# Altium footprint library WE-RJ45 LAN.PcbLib: 107 footprints (part 1 of 7)
Each footprint in its own frame and in the unit in brackets; x right, y up, seen from the top. Pads: shape width x height; smd on the part's side, far side on the other; paste and mask are expansions set on the pad; w line width, h text height; cw(c..) or ccw(c..) is an arc to the next point about the centre after c.
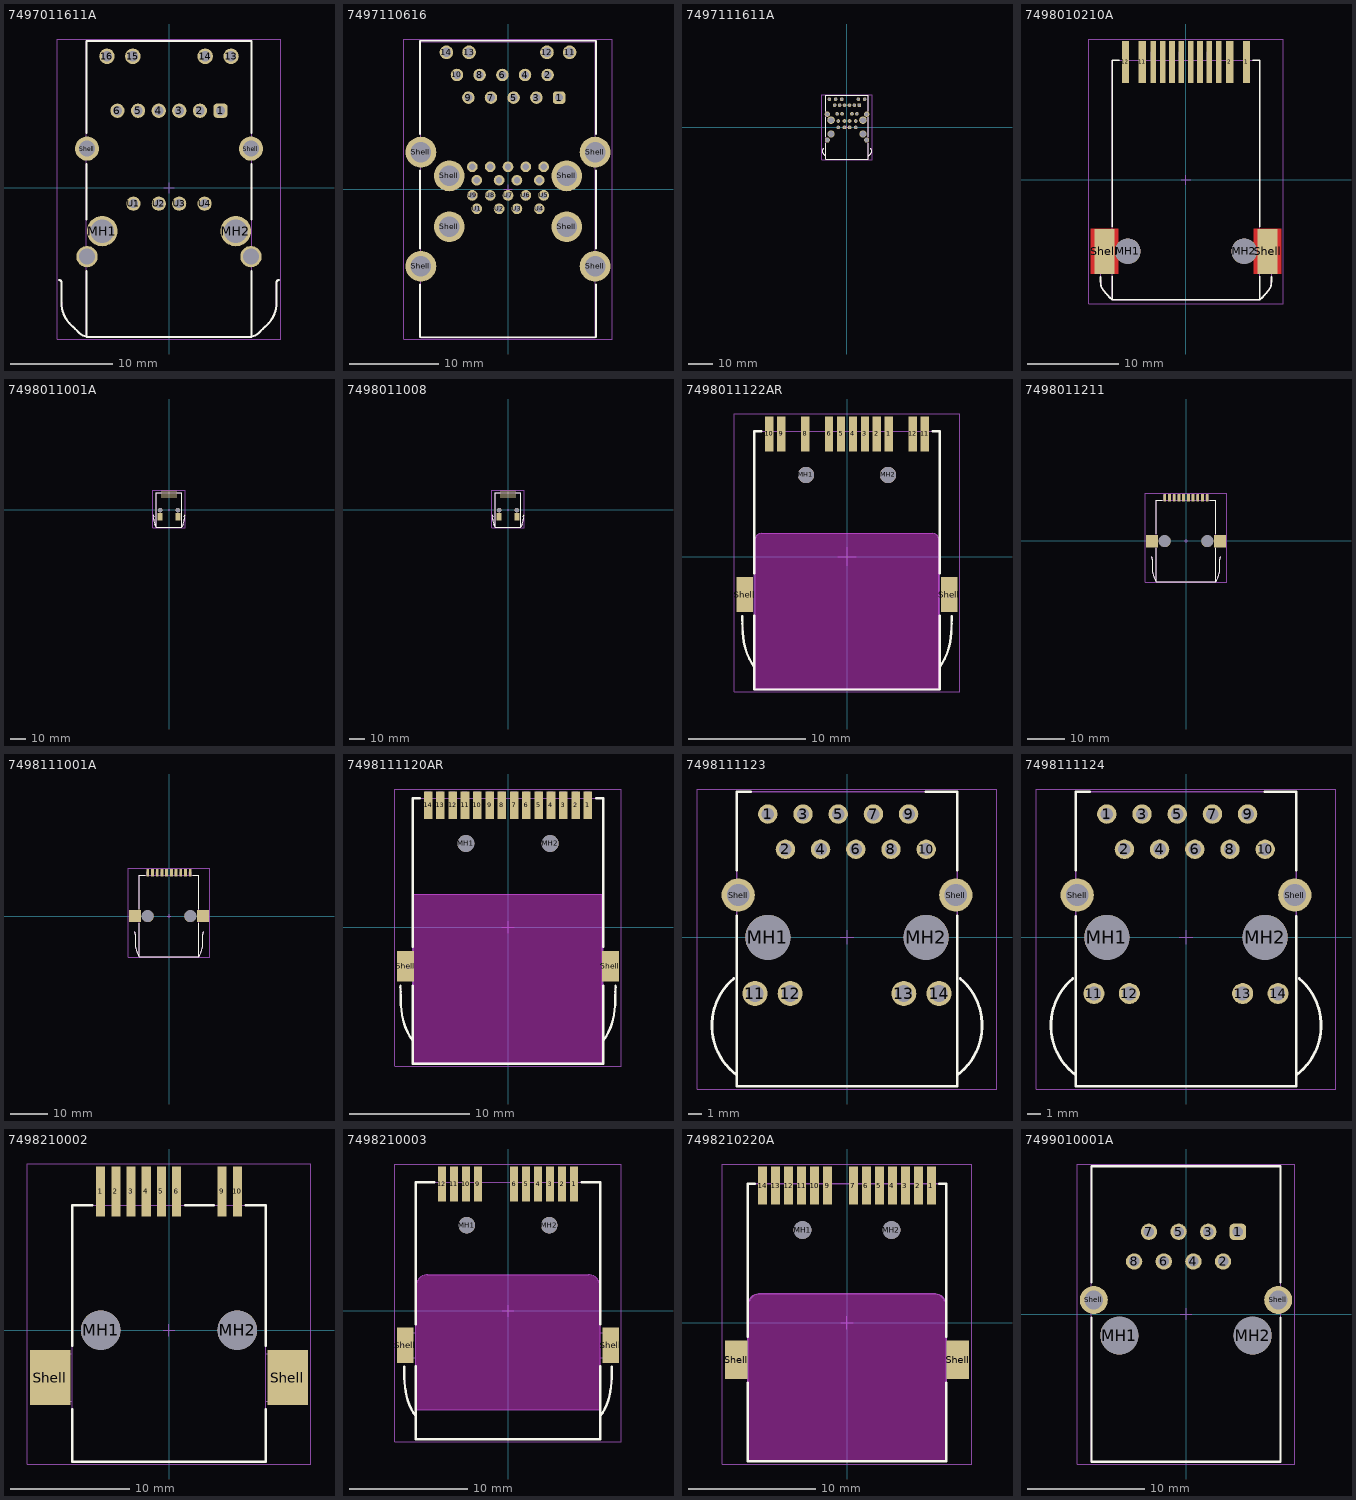
[diagram p0: the footprints below, top view; thin cyan lines are the x and y axes]

## 7497011611A [mm] "LAN Transformer, body 29x16.25mm"
height 24.42
pads (20):
  rrect50% 1.4x1.4 hole 0.9: 1(5.07,7.6)
  round 1.4 hole 0.9: 2(3.04,7.6) 3(1.01,7.6) 4(-1.01,7.6) 5(-3.04,7.6) 6(-5.07,7.6) U1(-3.5,-1.54) U2(-1,-1.54) U3(1,-1.54) U4(3.5,-1.54)
  round 1.52 hole 1.02: 13(6.1,12.95) 14(3.56,12.95) 15(-3.56,12.95) 16(-6.1,12.95)
  round 3 hole 2.31: MH1(-6.57,-4.24) MH2(6.57,-4.24)
  round 2.1 hole 1.57: Shell(-8.06,-6.75) Shell(8.06,-6.75)
  round 2.37 hole 1.57: Shell(-8.06,3.87) Shell(8.06,3.87)
Top Overlay:
  lines w0.2: -10.815,-9.05 cw(c-10.815,-9.3) -10.565,-9.3 -10.565,-11.3 ccw(c-7.565,-11.3) -9.412,-13.664 ; -9.415,-13.666 ccw(c-7.628,-12.131) -9.059,-14.003 ccw(c-7.825,-13.15) -8.119,-14.621 ; -8.125,-8.15 -8.125,-14.65 8.125,-14.65 8.125,-8.15 ; -8.125,-3.1 -8.125,2.34 ; -8.125,5.4 -8.125,14.45 8.125,14.45 8.125,5.4 ; 8.125,-3.1 8.125,2.34 ; 9.412,-13.664 ccw(c7.565,-11.3) 10.565,-11.3 10.565,-9.3 cw(c10.815,-9.3) 10.815,-9.05 ; 9.059,-14.003 ccw(c7.628,-12.131) 9.415,-13.666 cw(c7.628,-12.131) 9.059,-14.003 ; 9.059,-14.003 cw(c7.825,-13.15) 8.119,-14.621 ccw(c7.825,-13.15) 9.059,-14.003
Top Designator:
  text ".Designator" at -7.498,-0.5 h1.5
Top Component Outline:
  lines w0.1: -10.815,-9.05 cw(c-10.815,-9.3) -10.565,-9.3 -10.565,-11.3 ccw(c-7.565,-11.3) -9.412,-13.664 ; -9.415,-13.666 ccw(c-7.628,-12.131) -9.059,-14.003 ccw(c-7.825,-13.15) -8.119,-14.621 ; 8.119,-14.621 ccw(c7.825,-13.15) 9.059,-14.003 ccw(c7.628,-12.131) 9.415,-13.666 ; 9.412,-13.664 ccw(c7.565,-11.3) 10.565,-11.3 10.565,-9.3 cw(c10.815,-9.3) 10.815,-9.05 ; -8.125,-14.65 8.125,-14.65 8.125,14.45 -8.125,14.45 -8.125,-14.65
Top 3D Body:
  lines w0.1: -10.815,-9.05 cw(c-10.815,-9.3) -10.565,-9.3 -10.565,-11.3 ccw(c-7.565,-11.3) -9.412,-13.664 ; -9.415,-13.666 ccw(c-7.628,-12.131) -9.059,-14.003 ccw(c-7.825,-13.15) -8.119,-14.621 ; 8.119,-14.621 ccw(c7.825,-13.15) 9.059,-14.003 ccw(c7.628,-12.131) 9.415,-13.666 ; 9.412,-13.664 ccw(c7.565,-11.3) 10.565,-11.3 10.565,-9.3 cw(c10.815,-9.3) 10.815,-9.05 ; -8.125,-14.65 -8.125,14.45 8.125,14.45 8.125,-14.65 -8.125,-14.65
Top Courtyard:
  lines w0.05: -0.5,0 0.5,0 ; 0,-0.5 0,0.5 ; -11.01,-14.85 11.01,-14.85 11.01,14.65 -11.01,14.65 -11.01,-14.85
3D body "7497011611A.stp": height 24.39, standoff -3.7, extent -10.865,-14.6 10.865,14.5

## 7497110616 [mm] "LAN Transformer, body 33x19.5mm"
height 32
pads (40):
  rrect50% 1.4x1.4 hole 0.89: 1(5.715,10.23)
  round 1.4 hole 0.89: 2(4.445,12.77) 3(3.175,10.23) 4(1.905,12.77) 5(0.635,10.23) 6(-0.635,12.77) 7(-1.905,10.23) 8(-3.175,12.77) 9(-4.445,10.23) 10(-5.715,12.77)
  round 1.53 hole 1.03: 11(6.9,15.31) 12(4.36,15.31) 13(-4.36,15.31) 14(-6.9,15.31)
  round 3.45 hole 2.3: Shell(-9.75,-8.65) Shell(-9.75,4.13) Shell(-6.57,-4.22) Shell(-6.57,1.46) Shell(6.57,-4.22) Shell(6.57,1.46) Shell(9.75,-8.65) Shell(9.75,4.13)
  round 1.2 hole 0.7: U1(-3.5,-2.22) U2(-1,-2.22) U3(1,-2.22) U4(3.5,-2.22) U5(4,-0.72) U6(2,-0.72) U7(0,-0.72) U8(-2,-0.72) U9(-4,-0.72) U10(-3.5,0.98) U11(-1,0.98) U12(1,0.98) U13(3.5,0.98) U14(4,2.48) U15(2,2.48) U16(0,2.48) U17(-2,2.48) U18(-4,2.48)
Top Overlay:
  lines w0.2: -9.85,-10.7 -9.85,-16.6 9.85,-16.6 9.85,-10.7 ; -9.85,-6.65 -9.85,2.1 ; -9.85,6.16 -9.85,16.6 9.85,16.6 9.85,6.16 ; 9.85,-6.65 9.85,2.1
Top Designator:
  text ".Designator" at -7.498,-0.5 h1.5
Top Component Outline:
  lines w0.1: -9.75,-16.67 9.75,-16.67 9.75,16.5 -9.75,16.5 -9.75,-16.67
Top 3D Body:
  lines w0.1: -9.75,-16.67 -9.75,16.5 9.75,16.5 9.75,-16.67 -9.75,-16.67
Top Courtyard:
  lines w0.05: -0.5,0 0.5,0 ; 0,-0.5 0,0.5 ; -11.675,-16.8 -11.675,16.8 11.675,16.8 11.675,-16.8 -11.675,-16.8
3D body "7497110616.stp": height 32.15, standoff -3.05, extent -9.75,-16.65 9.75,16.5

## 7497111611A [mm] "LAN Transformer, body 26.09x17.09mm"
height 29.67
pads (31):
  rrect50% 1.5x1.5 hole 0.97: 1(5.075,9.055)
  round 1.5 hole 0.97: 2(3.045,9.055) 3(1.015,9.055) 4(-1.015,9.055) 5(-3.045,9.055) 6(-5.075,9.055) 7(4.06,5.505) 8(2.03,5.505) 9(-2.03,5.505) 10(-4.06,5.505) 11(7.225,11.485) 12(4.685,11.485) 14(-2.145,11.485) 15(-4.685,11.485) 16(-7.225,11.485) U1(-3.55,-0.085) U2(-1.05,-0.085) U3(1.05,-0.085) U4(3.55,-0.085) U5(-3.55,2.535) U6(-1.05,2.535) U7(1.05,2.535) U8(3.55,2.535)
  round 2.1 hole 1.57: Shell(-8.065,-5.295) Shell(8.065,-5.295)
  round 2.2 hole 1.57: Shell(-8.065,5.325) Shell(8.065,5.325)
  round 2.9 hole 2.31: Shell(-6.565,-2.785) Shell(6.565,-2.785)
  round 3.1 hole 2.31: Shell(-6.565,2.905) Shell(6.565,2.905)
Top Overlay:
  lines w0.2: -10.004,-9.277 ccw(c-8.751,-9.966) -10.176,-10.092 ccw(c-7.845,-9.245) -9.497,-11.095 cw(c-30.82,-33.32) -8.645,-11.945 ; -9.988,-9.229 cw(c-8.245,-9.845) -9.689,-8.69 ; -8.645,-6.595 -8.645,-13.145 8.645,-13.145 8.645,-6.595 ; -8.645,-3.995 -8.645,4.055 ; -8.645,6.595 -8.645,13.145 8.645,13.145 8.645,6.595 ; 8.645,-11.945 cw(c30.821,-33.32) 9.497,-11.095 ccw(c7.845,-9.245) 10.176,-10.092 ccw(c8.751,-9.966) 10.005,-9.277 ; 8.645,-3.995 8.645,4.055 ; 9.689,-8.69 cw(c8.245,-9.845) 9.989,-9.229
Top Designator:
  text ".Designator" at -7.498,-0.5 h1.5
Top Component Outline:
  lines w0.1: -10.004,-9.277 ccw(c-8.751,-9.966) -10.176,-10.092 ccw(c-7.845,-9.245) -9.497,-11.095 cw(c-30.82,-33.32) -8.645,-11.945 ; -9.988,-9.229 cw(c-8.245,-9.845) -9.689,-8.69 ; 8.645,-11.945 cw(c30.821,-33.32) 9.497,-11.095 ccw(c7.845,-9.245) 10.176,-10.092 ccw(c8.751,-9.966) 10.005,-9.277 ; 9.689,-8.69 cw(c8.245,-9.845) 9.989,-9.229 ; -8.645,-13.145 -8.645,13.145 8.645,13.145 8.645,-13.145 -8.645,-13.145
Top 3D Body:
  lines w0.1: -10.004,-9.277 ccw(c-8.751,-9.966) -10.176,-10.092 ccw(c-7.845,-9.245) -9.497,-11.095 cw(c-30.82,-33.32) -8.645,-11.945 ; -9.988,-9.229 cw(c-8.245,-9.845) -9.689,-8.69 ; 8.645,-11.945 cw(c30.821,-33.32) 9.497,-11.095 ccw(c7.845,-9.245) 10.176,-10.092 ccw(c8.751,-9.966) 10.005,-9.277 ; 9.689,-8.69 cw(c8.245,-9.845) 9.989,-9.229 ; -8.645,-13.145 8.645,-13.145 8.645,13.145 -8.645,13.145 -8.645,-13.145
Top Courtyard:
  lines w0.05: -0.5,0 0.5,0 ; 0,-0.5 0,0.5 ; -10.344,-13.345 10.344,-13.345 10.344,13.345 -10.344,13.345 -10.344,-13.345
3D body "7497111611A.stp": height 31.43, standoff -3.83, extent -10.144,-13.045 10.144,13.045

## 7498010210A [mm] "LAN Transformer, body 16.1x25.4mm"
height 13.61
pads (16):
  rect 0.81x4.6 smd: 1(6.61,12.895) 2(4.77,12.895) 11(-4.77,12.895) 12(-6.61,12.895)
  rect 0.61x4.6 smd: 3(3.57,12.895) 4(2.55,12.895) 5(1.53,12.895) 6(0.51,12.895) 7(-0.51,12.895) 8(-1.53,12.895) 9(-2.55,12.895) 10(-3.57,12.895)
  round 2.8 hole 2.8 unplated: MH1(-6.35,-7.795) MH2(6.35,-7.795)
  rect 2.2x4.9 smd paste-403.566 mask+0.102: Shell(-8.92,-7.795)
  rect 2.2x4.9 smd paste+0 mask+0.102: Shell(8.92,-7.795)
Top Layer:
  region: -10.42,-10.245 -10.42,-5.345 -7.42,-5.345 -7.42,-6.893 -7.42,-6.892 -7.495,-6.989 -7.618,-7.201 -7.702,-7.431 -7.745,-7.672 -7.745,-7.917 -7.702,-8.159 -7.618,-8.389 -7.495,-8.6 -7.42,-8.697 -7.42,-10.245
  region: 10.42,-10.245 10.42,-5.345 7.42,-5.345 7.42,-6.893 7.42,-6.892 7.495,-6.989 7.618,-7.201 7.702,-7.431 7.745,-7.672 7.745,-7.917 7.702,-8.159 7.618,-8.389 7.495,-8.6 7.42,-8.697 7.42,-10.245
Top Overlay:
  lines w0.2: -9.351,-10.589 ccw(c-2.472,-10.49) -9.325,-11.09 ccw(c-7.272,-11.09) -9.2,-11.795 ccw(c-4.225,-8.48) -8.05,-13.075 ; -8.05,-10.525 -8.05,-13.075 ; -8.05,-5.075 -8.05,13.075 -7.3,13.075 ; 7.3,13.075 8.05,13.075 8.05,-5.075 ; 8.05,-10.525 8.05,-13.075 ; 9.351,-10.589 cw(c2.472,-10.49) 9.325,-11.09 cw(c7.272,-11.09) 9.2,-11.795 cw(c4.225,-8.48) 8.05,-13.075 ; -8.05,-13.075 8.05,-13.075
Top Designator:
  text ".Designator" at -7.498,-0.5 h1.5
Top Component Outline:
  lines w0.1: -9.688,-5.908 cw(c-10.109,-6.494) -9.395,-6.595 -9.351,-10.589 ccw(c-2.472,-10.49) -9.325,-11.09 ccw(c-7.272,-11.09) -9.2,-11.795 ccw(c-4.225,-8.48) -8.05,-13.075 ; -6.835,13.075 -6.835,13.985 -6.385,13.985 -6.385,13.075 ; -4.995,13.075 -4.995,13.985 -4.545,13.985 -4.545,13.075 ; -3.795,13.075 -3.795,13.985 -3.345,13.985 -3.345,13.075 ; -2.775,13.075 -2.775,13.985 -2.325,13.985 -2.325,13.075 ; -1.755,13.075 -1.755,13.985 -1.305,13.985 -1.305,13.075 ; -0.735,13.075 -0.735,13.985 -0.285,13.985 -0.285,13.075 ; 0.285,13.075 0.285,13.985 0.735,13.985 0.735,13.075 ; 1.305,13.075 1.305,13.985 1.755,13.985 1.755,13.075 ; 2.325,13.075 2.325,13.985 2.775,13.985 2.775,13.075 ; 3.345,13.075 3.345,13.985 3.795,13.985 3.795,13.075 ; 4.545,13.075 4.545,13.985 4.995,13.985 4.995,13.075 ; 6.385,13.075 6.385,13.985 6.835,13.985 6.835,13.075 ; 9.688,-5.908 ccw(c10.109,-6.494) 9.395,-6.595 9.351,-10.589 cw(c2.472,-10.49) 9.325,-11.09 cw(c7.272,-11.09) 9.2,-11.795 cw(c4.225,-8.48) 8.05,-13.075 ; -8.05,-13.075 8.05,-13.075 ; -8.05,-13.075 -8.05,13.075 8.05,13.075 8.05,-13.075
Top 3D Body:
  lines w0.1: -9.688,-5.908 cw(c-10.109,-6.494) -9.395,-6.595 -9.351,-10.589 ccw(c-2.472,-10.49) -9.325,-11.09 ccw(c-7.272,-11.09) -9.2,-11.795 ccw(c-4.225,-8.48) -8.05,-13.075 ; -6.835,13.075 -6.835,13.985 -6.385,13.985 -6.385,13.075 ; -4.995,13.075 -4.995,13.985 -4.545,13.985 -4.545,13.075 ; -3.795,13.075 -3.795,13.985 -3.345,13.985 -3.345,13.075 ; -2.775,13.075 -2.775,13.985 -2.325,13.985 -2.325,13.075 ; -1.755,13.075 -1.755,13.985 -1.305,13.985 -1.305,13.075 ; -0.735,13.075 -0.735,13.985 -0.285,13.985 -0.285,13.075 ; 0.285,13.075 0.285,13.985 0.735,13.985 0.735,13.075 ; 1.305,13.075 1.305,13.985 1.755,13.985 1.755,13.075 ; 2.325,13.075 2.325,13.985 2.775,13.985 2.775,13.075 ; 3.345,13.075 3.345,13.985 3.795,13.985 3.795,13.075 ; 4.545,13.075 4.545,13.985 4.995,13.985 4.995,13.075 ; 6.385,13.075 6.385,13.985 6.835,13.985 6.835,13.075 ; 9.688,-5.908 ccw(c10.109,-6.494) 9.395,-6.595 9.351,-10.589 cw(c2.472,-10.49) 9.325,-11.09 cw(c7.272,-11.09) 9.2,-11.795 cw(c4.225,-8.48) 8.05,-13.075 ; -8.05,-13.075 -8.05,13.075 8.05,13.075 8.05,-13.075 ; -8.05,-13.075 8.05,-13.075
Top Courtyard:
  lines w0.05: -0.5,0 0.5,0 ; 0,-0.5 0,0.5 ; -10.62,-13.525 -10.62,15.395 10.62,15.395 10.62,-13.525 -10.62,-13.525
3D body "7498010210A.stp": height 15.66, standoff -0.85, extent -9.65,-13.325 9.65,13.985

## 7498011001A [mm] "LAN Transformer, body 21.95x16.26mm"
height 13.6
pads (12):
  rect 0.76x5 smd: 1(-4.445,10.125) 2(-3.175,10.125) 3(-1.905,10.125) 4(-0.635,10.125) 5(0.635,10.125) 6(1.905,10.125) 7(3.175,10.125) 8(4.445,10.125)
  round 2.9 hole 2.9 unplated: MH1(-5.715,-0.075) MH2(5.715,-0.075)
  rect 3.42x4.58 smd: Shell(-5.79,-4.315) Shell(5.79,-4.315)
Top Overlay:
  lines w0.2: -10.12,-3.265 cw(c-10.63,-3.775) -9.916,-3.876 ccw(c2.77,-5.175) -9.899,-6.628 ccw(c4.334,-3.766) -9.039,-9.417 cw(c-49.045,-34.875) -8.441,-10.383 cw(c-9.628,-11.274) -8.23,-10.775 ; -5.13,11.075 -8.23,11.075 -8.23,-11.075 8.23,-11.075 8.23,11.075 5.13,11.075 ; 8.23,-10.775 cw(c9.628,-11.274) 8.441,-10.383 cw(c49.045,-34.875) 9.039,-9.417 ccw(c-4.334,-3.766) 9.899,-6.628 ccw(c-2.77,-5.175) 9.916,-3.876 cw(c10.63,-3.775) 10.12,-3.265
Top Designator:
  text ".Designator" at -7.498,-0.5 h1.5
Top Component Outline:
  lines w0.1: -10.12,-3.265 cw(c-10.63,-3.775) -9.916,-3.876 ccw(c2.77,-5.175) -9.899,-6.628 ccw(c4.334,-3.766) -9.039,-9.417 cw(c-49.045,-34.875) -8.441,-10.383 cw(c-9.628,-11.274) -8.23,-10.775 ; 8.23,-10.775 cw(c9.628,-11.274) 8.441,-10.383 cw(c49.045,-34.875) 9.039,-9.417 ccw(c-4.334,-3.766) 9.899,-6.628 ccw(c-2.77,-5.175) 9.916,-3.876 cw(c10.63,-3.775) 10.12,-3.265 ; -8.23,-11.075 -8.23,11.075 8.23,11.075 8.23,-11.075 -8.23,-11.075
Top 3D Body:
  lines w0.1: -10.12,-3.265 cw(c-10.63,-3.775) -9.916,-3.876 ccw(c2.77,-5.175) -9.899,-6.628 ccw(c4.334,-3.766) -9.039,-9.417 cw(c-49.045,-34.875) -8.441,-10.383 cw(c-9.628,-11.274) -8.23,-10.775 ; 8.23,-10.775 cw(c9.628,-11.274) 8.441,-10.383 cw(c49.045,-34.875) 9.039,-9.417 ccw(c-4.334,-3.766) 9.899,-6.628 ccw(c-2.77,-5.175) 9.916,-3.876 cw(c10.63,-3.775) 10.12,-3.265 ; -8.23,-11.075 8.23,-11.075 8.23,11.075 -8.23,11.075 -8.23,-11.075
Top Courtyard:
  lines w0.05: -0.5,0 0.5,0 ; 0,-0.5 0,0.5 ; -10.32,-11.275 -10.32,12.825 10.32,12.825 10.32,-11.275 -10.32,-11.275
3D body "7498011001A.stp": height 15.62, standoff -0.73, extent -10.13,-10.975 10.13,11.607

## 7498011008 [mm] "LAN Transformer, body 21.95x16.26mm"
height 13.6
pads (12):
  rect 0.76x5 smd: 1(-4.445,10.125) 2(-3.175,10.125) 3(-1.905,10.125) 4(-0.635,10.125) 5(0.635,10.125) 6(1.905,10.125) 7(3.175,10.125) 8(4.445,10.125)
  round 2.9 hole 2.9 unplated: MH1(-5.715,-0.075) MH2(5.715,-0.075)
  rect 3.42x4.58 smd: Shell(-5.79,-4.315) Shell(5.79,-4.315)
Top Overlay:
  lines w0.2: -10.12,-3.265 cw(c-10.63,-3.775) -9.916,-3.876 ccw(c2.77,-5.175) -9.899,-6.628 ccw(c4.334,-3.766) -9.039,-9.417 cw(c-49.045,-34.875) -8.441,-10.383 cw(c-9.628,-11.274) -8.23,-10.775 ; -5.13,11.075 -8.23,11.075 -8.23,-11.075 8.23,-11.075 8.23,11.075 5.13,11.075 ; 8.23,-10.775 cw(c9.628,-11.274) 8.441,-10.383 cw(c49.045,-34.875) 9.039,-9.417 ccw(c-4.334,-3.766) 9.899,-6.628 ccw(c-2.77,-5.175) 9.916,-3.876 cw(c10.63,-3.775) 10.12,-3.265
Top Designator:
  text ".Designator" at -7.498,-0.5 h1.5
Top Component Outline:
  lines w0.1: -10.12,-3.265 cw(c-10.63,-3.775) -9.916,-3.876 ccw(c2.77,-5.175) -9.899,-6.628 ccw(c4.334,-3.766) -9.039,-9.417 cw(c-49.045,-34.875) -8.441,-10.383 cw(c-9.628,-11.274) -8.23,-10.775 ; 8.23,-10.775 cw(c9.628,-11.274) 8.441,-10.383 cw(c49.045,-34.875) 9.039,-9.417 ccw(c-4.334,-3.766) 9.899,-6.628 ccw(c-2.77,-5.175) 9.916,-3.876 cw(c10.63,-3.775) 10.12,-3.265 ; -8.23,-11.075 8.23,-11.075 8.23,11.075 -8.23,11.075 -8.23,-11.075
Top 3D Body:
  lines w0.1: -10.12,-3.265 cw(c-10.63,-3.775) -9.916,-3.876 ccw(c2.77,-5.175) -9.899,-6.628 ccw(c4.334,-3.766) -9.039,-9.417 cw(c-49.045,-34.875) -8.441,-10.383 cw(c-9.628,-11.274) -8.23,-10.775 ; 8.23,-10.775 cw(c9.628,-11.274) 8.441,-10.383 cw(c49.045,-34.875) 9.039,-9.417 ccw(c-4.334,-3.766) 9.899,-6.628 ccw(c-2.77,-5.175) 9.916,-3.876 cw(c10.63,-3.775) 10.12,-3.265 ; -8.23,-11.075 -8.23,11.075 8.23,11.075 8.23,-11.075 -8.23,-11.075
Top Courtyard:
  lines w0.05: -0.5,0 0.5,0 ; 0,-0.5 0,0.5 ; -10.32,-11.275 -10.32,12.825 10.32,12.825 10.32,-11.275 -10.32,-11.275
3D body "7498011008.stp": height 15.62, standoff -0.73, extent -10.13,-10.975 10.13,11.617

## 7498011122AR [mm] "LAN Transformer, body 21.84x15.65mm"
height 8.89
pads (15):
  rect 0.71x3 smd: 1(3.57,10.46) 2(2.55,10.46) 3(1.53,10.46) 4(0.51,10.46) 5(-0.51,10.46) 6(-1.53,10.46) 8(-3.57,10.46) 9(-5.61,10.46) 10(-6.63,10.46) 11(6.63,10.46) 12(5.61,10.46)
  round 1.4 hole 1.4 unplated: MH1(-3.5,6.96) MH2(3.5,6.96)
  rect 1.4x3 smd: Shell(-8.725,-3.24) Shell(8.725,-3.24)
Top Overlay:
  lines w0.2: -8.926,-5.104 ccw(c-7.186,-5.201) -8.922,-5.351 ccw(c-7.183,-5.447) -8.919,-5.597 ccw(c-7.179,-5.694) -8.915,-5.843 ccw(c-7.175,-5.94) -8.911,-6.09 ccw(c-1.375,-5.89) -8.847,-6.888 ccw(c-3.725,-6.44) -7.933,-9.395 ; -7.925,-5.05 -7.925,-11.34 7.925,-11.34 7.925,-5.05 ; -7.925,-1.45 -7.925,10.7 -7.3,10.7 ; 7.3,10.7 7.925,10.7 7.925,-1.45 ; 7.933,-9.395 ccw(c3.725,-6.44) 8.847,-6.888 ccw(c1.375,-5.89) 8.911,-6.09 ccw(c7.175,-5.94) 8.915,-5.843 ccw(c7.179,-5.694) 8.919,-5.597 ccw(c7.183,-5.447) 8.922,-5.351 ccw(c7.186,-5.201) 8.926,-5.104
Keep-Out Layer:
  board cut-out: -7.825,-11.24 -7.825,1.47 -7.825,1.569 -7.749,1.753 -7.608,1.894 -7.424,1.97 -7.325,1.97 7.325,1.97 7.424,1.97 7.608,1.894 7.749,1.753 7.825,1.569 7.825,1.47 7.825,-11.24
Top Designator:
  text ".Designator" at -7.498,-0.5 h1.5
Mechanical 8:
  lines w0.1: -7.825,-11.24 -7.825,1.47 cw(c-7.325,1.47) -7.325,1.97 7.325,1.97 cw(c7.325,1.47) 7.825,1.47 7.825,-11.24 -7.825,-11.24
  text "PCB Cutout Area" at -7,-5 h1.02
Top Component Outline:
  lines w0.1: -8.926,-5.104 ccw(c-7.186,-5.201) -8.922,-5.351 ccw(c-7.183,-5.447) -8.919,-5.597 ccw(c-7.179,-5.694) -8.915,-5.843 ccw(c-7.175,-5.94) -8.911,-6.09 ccw(c-1.375,-5.89) -8.847,-6.888 ccw(c-3.725,-6.44) -7.933,-9.395 ; 7.933,-9.395 ccw(c3.725,-6.44) 8.847,-6.888 ccw(c1.375,-5.89) 8.911,-6.09 ccw(c7.175,-5.94) 8.915,-5.843 ccw(c7.179,-5.694) 8.919,-5.597 ccw(c7.183,-5.447) 8.922,-5.351 ccw(c7.186,-5.201) 8.926,-5.104 ; -7.925,-11.34 7.925,-11.34 7.925,10.7 -7.925,10.7 -7.925,-11.34
Top 3D Body:
  lines w0.1: -8.926,-5.104 ccw(c-7.186,-5.201) -8.922,-5.351 ccw(c-7.183,-5.447) -8.919,-5.597 ccw(c-7.179,-5.694) -8.915,-5.843 ccw(c-7.175,-5.94) -8.911,-6.09 ccw(c-1.375,-5.89) -8.847,-6.888 ccw(c-3.725,-6.44) -7.933,-9.395 ; 7.933,-9.395 ccw(c3.725,-6.44) 8.847,-6.888 ccw(c1.375,-5.89) 8.911,-6.09 ccw(c7.175,-5.94) 8.915,-5.843 ccw(c7.179,-5.694) 8.919,-5.597 ccw(c7.183,-5.447) 8.922,-5.351 ccw(c7.186,-5.201) 8.926,-5.104 ; -7.925,-11.34 -7.925,10.7 7.925,10.7 7.925,-11.34 -7.925,-11.34
Top Courtyard:
  lines w0.05: -0.8,0 0.8,0 ; 0,-0.8 0,0.8 ; -9.625,-11.54 9.625,-11.54 9.625,12.16 -9.625,12.16 -9.625,-11.54
3D body "7498011122AR.stp": height 10.1, standoff -3.2, extent -9.075,-11.24 9.075,10.835
